# Altium footprint library SMDLibrary.PcbLib: 309 footprints (part 12 of 20)
Each footprint in its own frame and in the unit in brackets; x right, y up, seen from the top. Pads: shape width x height; smd on the part's side, far side on the other; paste and mask are expansions set on the pad; w line width, h text height; cw(c..) or ccw(c..) is an arc to the next point about the centre after c.
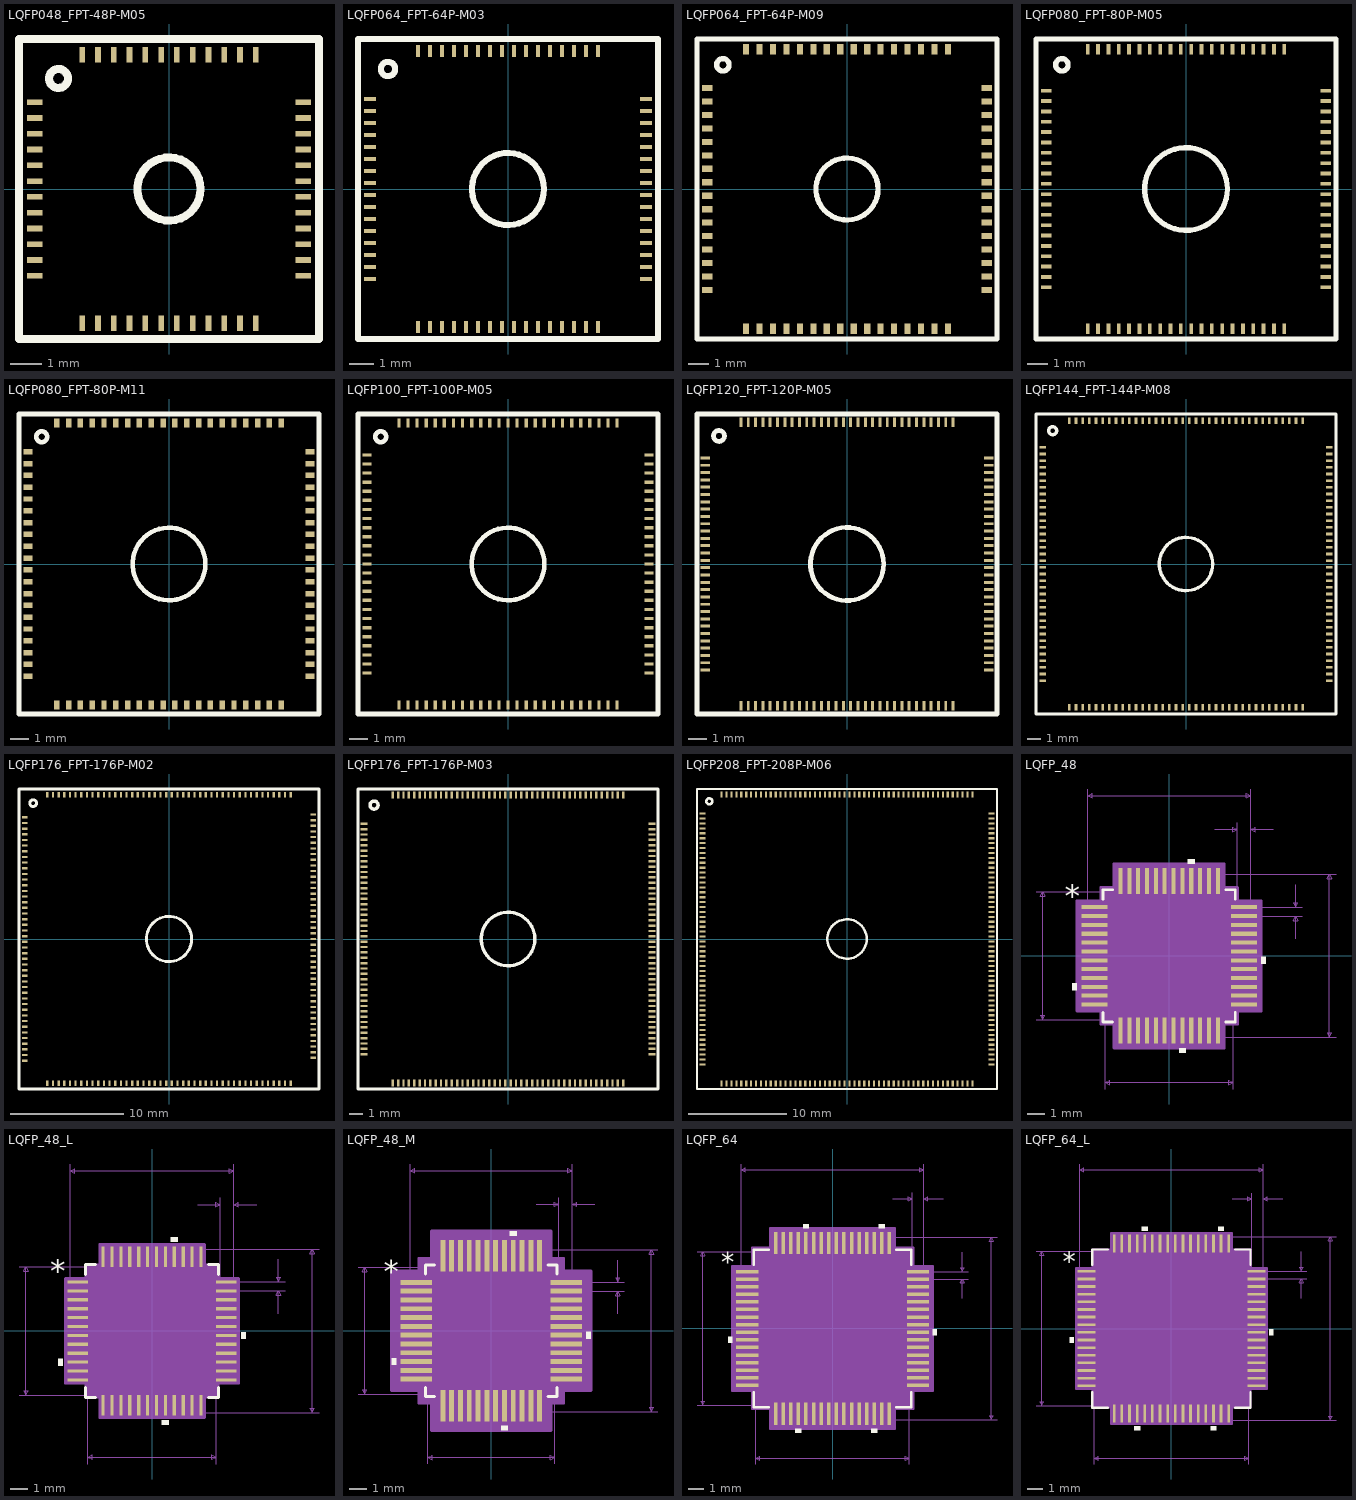
[diagram p11: the footprints below, top view; thin cyan lines are the x and y axes]

## LQFP048_FPT-48P-M05 [mm]
pads (48):
  rect 0.5x0.18 smd: 1(-4.25,2.75) 2(-4.25,2.25) 3(-4.25,1.75) 4(-4.25,1.25) 5(-4.25,0.75) 6(-4.25,0.25) 7(-4.25,-0.25) 8(-4.25,-0.75) 9(-4.25,-1.25) 10(-4.25,-1.75) 11(-4.25,-2.25) 12(-4.25,-2.75) 25(4.25,-2.75) 26(4.25,-2.25) 27(4.25,-1.75) 28(4.25,-1.25) 29(4.25,-0.75) 30(4.25,-0.25) 31(4.25,0.25) 32(4.25,0.75) 33(4.25,1.25) 34(4.25,1.75) 35(4.25,2.25) 36(4.25,2.75)
  rect 0.18x0.5 smd: 13(-2.75,-4.25) 14(-2.25,-4.25) 15(-1.75,-4.25) 16(-1.25,-4.25) 17(-0.75,-4.25) 18(-0.25,-4.25) 19(0.25,-4.25) 20(0.75,-4.25) 21(1.25,-4.25) 22(1.75,-4.25) 23(2.25,-4.25) 24(2.75,-4.25) 37(2.75,4.25) 38(2.25,4.25) 39(1.75,4.25) 40(1.25,4.25) 41(0.75,4.25) 42(0.25,4.25) 43(-0.25,4.25) 44(-0.75,4.25) 45(-1.25,4.25) 46(-1.75,4.25) 47(-2.25,4.25) 48(-2.75,4.25)
Top Overlay:
  circle w0.254: c0,0 r1
  circle w0.254: c-3.5,3.5 r0.3
  lines w0.254: -4.75,-4.75 4.75,-4.75 4.75,4.75 -4.75,4.75 -4.75,-4.75
3D body "LQFP48_FPT-48P-M05.stp": height 1.5, standoff 0, extent -4.5,-4.5 4.5,4.5

## LQFP064_FPT-64P-M03 [mm]
pads (64):
  rect 0.5x0.18 smd: 1(-5.75,3.75) 2(-5.75,3.25) 3(-5.75,2.75) 4(-5.75,2.25) 5(-5.75,1.75) 6(-5.75,1.25) 7(-5.75,0.75) 8(-5.75,0.25) 9(-5.75,-0.25) 10(-5.75,-0.75) 11(-5.75,-1.25) 12(-5.75,-1.75) 13(-5.75,-2.25) 14(-5.75,-2.75) 15(-5.75,-3.25) 16(-5.75,-3.75) 33(5.75,-3.75) 34(5.75,-3.25) 35(5.75,-2.75) 36(5.75,-2.25) 37(5.75,-1.75) 38(5.75,-1.25) 39(5.75,-0.75) 40(5.75,-0.25) 41(5.75,0.25) 42(5.75,0.75) 43(5.75,1.25) 44(5.75,1.75) 45(5.75,2.25) 46(5.75,2.75) 47(5.75,3.25) 48(5.75,3.75)
  rect 0.18x0.5 smd: 17(-3.75,-5.75) 18(-3.25,-5.75) 19(-2.75,-5.75) 20(-2.25,-5.75) 21(-1.75,-5.75) 22(-1.25,-5.75) 23(-0.75,-5.75) 24(-0.25,-5.75) 25(0.25,-5.75) 26(0.75,-5.75) 27(1.25,-5.75) 28(1.75,-5.75) 29(2.25,-5.75) 30(2.75,-5.75) 31(3.25,-5.75) 32(3.75,-5.75) 49(3.75,5.75) 50(3.25,5.75) 51(2.75,5.75) 52(2.25,5.75) 53(1.75,5.75) 54(1.25,5.75) 55(0.75,5.75) 56(0.25,5.75) 57(-0.25,5.75) 58(-0.75,5.75) 59(-1.25,5.75) 60(-1.75,5.75) 61(-2.25,5.75) 62(-2.75,5.75) 63(-3.25,5.75) 64(-3.75,5.75)
Top Overlay:
  circle w0.254: c0,0 r1.5
  circle w0.254: c-5,5 r0.3
  lines w0.254: -6.25,-6.25 -6.25,6.25 6.25,6.25 6.25,-6.25 -6.25,-6.25
3D body "LQFP64_FPT-64P-M03.stp": height 1.5, standoff 0, extent -6,-6 6,6

## LQFP064_FPT-64P-M09 [mm]
pads (64):
  rect 0.5x0.3 smd: 1(-6.75,4.875) 2(-6.75,4.225) 3(-6.75,3.575) 4(-6.75,2.925) 5(-6.75,2.275) 6(-6.75,1.625) 7(-6.75,0.975) 8(-6.75,0.325) 9(-6.75,-0.325) 10(-6.75,-0.975) 11(-6.75,-1.625) 12(-6.75,-2.275) 13(-6.75,-2.925) 14(-6.75,-3.575) 15(-6.75,-4.225) 16(-6.75,-4.875) 33(6.75,-4.875) 34(6.75,-4.225) 35(6.75,-3.575) 36(6.75,-2.925) 37(6.75,-2.275) 38(6.75,-1.625) 39(6.75,-0.975) 40(6.75,-0.325) 41(6.75,0.325) 42(6.75,0.975) 43(6.75,1.625) 44(6.75,2.275) 45(6.75,2.925) 46(6.75,3.575) 47(6.75,4.225) 48(6.75,4.875)
  rect 0.3x0.5 smd: 17(-4.875,-6.75) 18(-4.225,-6.75) 19(-3.575,-6.75) 20(-2.925,-6.75) 21(-2.275,-6.75) 22(-1.625,-6.75) 23(-0.975,-6.75) 24(-0.325,-6.75) 25(0.325,-6.75) 26(0.975,-6.75) 27(1.625,-6.75) 28(2.275,-6.75) 29(2.925,-6.75) 30(3.575,-6.75) 31(4.225,-6.75) 32(4.875,-6.75) 49(4.875,6.75) 50(4.225,6.75) 51(3.575,6.75) 52(2.925,6.75) 53(2.275,6.75) 54(1.625,6.75) 55(0.975,6.75) 56(0.325,6.75) 57(-0.325,6.75) 58(-0.975,6.75) 59(-1.625,6.75) 60(-2.275,6.75) 61(-2.925,6.75) 62(-3.575,6.75) 63(-4.225,6.75) 64(-4.875,6.75)
Top Overlay:
  circle w0.254: c-6,6 r0.3
  circle w0.254: c0,0 r1.5
  lines w0.254: -7.25,-7.25 -7.25,7.25 7.25,7.25 7.25,-7.25 -7.25,-7.25
3D body "LQFP64_FPT-64P-M09.stp": height 1.5, standoff 0, extent -7,-7 7,7

## LQFP080_FPT-80P-M05 [mm]
pads (80):
  rect 0.5x0.18 smd: 1(-6.75,4.75) 2(-6.75,4.25) 3(-6.75,3.75) 4(-6.75,3.25) 5(-6.75,2.75) 6(-6.75,2.25) 7(-6.75,1.75) 8(-6.75,1.25) 9(-6.75,0.75) 10(-6.75,0.25) 11(-6.75,-0.25) 12(-6.75,-0.75) 13(-6.75,-1.25) 14(-6.75,-1.75) 15(-6.75,-2.25) 16(-6.75,-2.75) 17(-6.75,-3.25) 18(-6.75,-3.75) 19(-6.75,-4.25) 20(-6.75,-4.75) 41(6.75,-4.75) 42(6.75,-4.25) 43(6.75,-3.75) 44(6.75,-3.25) 45(6.75,-2.75) 46(6.75,-2.25) 47(6.75,-1.75) 48(6.75,-1.25) 49(6.75,-0.75) 50(6.75,-0.25) 51(6.75,0.25) 52(6.75,0.75) 53(6.75,1.25) 54(6.75,1.75) 55(6.75,2.25) 56(6.75,2.75) 57(6.75,3.25) 58(6.75,3.75) 59(6.75,4.25) 60(6.75,4.75)
  rect 0.18x0.5 smd: 21(-4.75,-6.75) 22(-4.25,-6.75) 23(-3.75,-6.75) 24(-3.25,-6.75) 25(-2.75,-6.75) 26(-2.25,-6.75) 27(-1.75,-6.75) 28(-1.25,-6.75) 29(-0.75,-6.75) 30(-0.25,-6.75) 31(0.25,-6.75) 32(0.75,-6.75) 33(1.25,-6.75) 34(1.75,-6.75) 35(2.25,-6.75) 36(2.75,-6.75) 37(3.25,-6.75) 38(3.75,-6.75) 39(4.25,-6.75) 40(4.75,-6.75) 61(4.75,6.75) 62(4.25,6.75) 63(3.75,6.75) 64(3.25,6.75) 65(2.75,6.75) 66(2.25,6.75) 67(1.75,6.75) 68(1.25,6.75) 69(0.75,6.75) 70(0.25,6.75) 71(-0.25,6.75) 72(-0.75,6.75) 73(-1.25,6.75) 74(-1.75,6.75) 75(-2.25,6.75) 76(-2.75,6.75) 77(-3.25,6.75) 78(-3.75,6.75) 79(-4.25,6.75) 80(-4.75,6.75)
Top Overlay:
  circle w0.254: c0,0 r2
  circle w0.254: c-6,6 r0.3
  lines w0.254: -7.25,-7.25 -7.25,7.25 7.25,7.25 7.25,-7.25 -7.25,-7.25
3D body "LQFP80_FPT-80P-M05.stp": height 1.5, standoff 0, extent -7,-7 7,7

## LQFP080_FPT-80P-M11 [mm]
pads (80):
  rect 0.5x0.3 smd: 1(-7.75,6.175) 2(-7.75,5.525) 3(-7.75,4.875) 4(-7.75,4.225) 5(-7.75,3.575) 6(-7.75,2.925) 7(-7.75,2.275) 8(-7.75,1.625) 9(-7.75,0.975) 10(-7.75,0.325) 11(-7.75,-0.325) 12(-7.75,-0.975) 13(-7.75,-1.625) 14(-7.75,-2.275) 15(-7.75,-2.925) 16(-7.75,-3.575) 17(-7.75,-4.225) 18(-7.75,-4.875) 19(-7.75,-5.525) 20(-7.75,-6.175) 41(7.75,-6.175) 42(7.75,-5.525) 43(7.75,-4.875) 44(7.75,-4.225) 45(7.75,-3.575) 46(7.75,-2.925) 47(7.75,-2.275) 48(7.75,-1.625) 49(7.75,-0.975) 50(7.75,-0.325) 51(7.75,0.325) 52(7.75,0.975) 53(7.75,1.625) 54(7.75,2.275) 55(7.75,2.925) 56(7.75,3.575) 57(7.75,4.225) 58(7.75,4.875) 59(7.75,5.525) 60(7.75,6.175)
  rect 0.3x0.5 smd: 21(-6.175,-7.75) 22(-5.525,-7.75) 23(-4.875,-7.75) 24(-4.225,-7.75) 25(-3.575,-7.75) 26(-2.925,-7.75) 27(-2.275,-7.75) 28(-1.625,-7.75) 29(-0.975,-7.75) 30(-0.325,-7.75) 31(0.325,-7.75) 32(0.975,-7.75) 33(1.625,-7.75) 34(2.275,-7.75) 35(2.925,-7.75) 36(3.575,-7.75) 37(4.225,-7.75) 38(4.875,-7.75) 39(5.525,-7.75) 40(6.175,-7.75) 61(6.175,7.75) 62(5.525,7.75) 63(4.875,7.75) 64(4.225,7.75) 65(3.575,7.75) 66(2.925,7.75) 67(2.275,7.75) 68(1.625,7.75) 69(0.975,7.75) 70(0.325,7.75) 71(-0.325,7.75) 72(-0.975,7.75) 73(-1.625,7.75) 74(-2.275,7.75) 75(-2.925,7.75) 76(-3.575,7.75) 77(-4.225,7.75) 78(-4.875,7.75) 79(-5.525,7.75) 80(-6.175,7.75)
Top Overlay:
  circle w0.254: c0,0 r2
  circle w0.254: c-7,7 r0.3
  lines w0.254: -8.25,-8.25 -8.25,8.25 8.25,8.25 8.25,-8.25 -8.25,-8.25
3D body "LQFP80_FPT-80P-M11.stp": height 1.5, standoff 0, extent -8,-8 8,8

## LQFP100_FPT-100P-M05 [mm]
pads (100):
  rect 0.5x0.18 smd: 1(-7.75,6) 2(-7.75,5.5) 3(-7.75,5) 4(-7.75,4.5) 5(-7.75,4) 6(-7.75,3.5) 7(-7.75,3) 8(-7.75,2.5) 9(-7.75,2) 10(-7.75,1.5) 11(-7.75,1) 12(-7.75,0.5) 13(-7.75,0) 14(-7.75,-0.5) 15(-7.75,-1) 16(-7.75,-1.5) 17(-7.75,-2) 18(-7.75,-2.5) 19(-7.75,-3) 20(-7.75,-3.5) 21(-7.75,-4) 22(-7.75,-4.5) 23(-7.75,-5) 24(-7.75,-5.5) 25(-7.75,-6) 51(7.75,-6) 52(7.75,-5.5) 53(7.75,-5) 54(7.75,-4.5) 55(7.75,-4) 56(7.75,-3.5) 57(7.75,-3) 58(7.75,-2.5) 59(7.75,-2) 60(7.75,-1.5) 61(7.75,-1) 62(7.75,-0.5) 63(7.75,0) 64(7.75,0.5) 65(7.75,1) 66(7.75,1.5) 67(7.75,2) 68(7.75,2.5) 69(7.75,3) 70(7.75,3.5) 71(7.75,4) 72(7.75,4.5) 73(7.75,5) 74(7.75,5.5) 75(7.75,6)
  rect 0.18x0.5 smd: 26(-6,-7.75) 27(-5.5,-7.75) 28(-5,-7.75) 29(-4.5,-7.75) 30(-4,-7.75) 31(-3.5,-7.75) 32(-3,-7.75) 33(-2.5,-7.75) 34(-2,-7.75) 35(-1.5,-7.75) 36(-1,-7.75) 37(-0.5,-7.75) 38(0,-7.75) 39(0.5,-7.75) 40(1,-7.75) 41(1.5,-7.75) 42(2,-7.75) 43(2.5,-7.75) 44(3,-7.75) 45(3.5,-7.75) 46(4,-7.75) 47(4.5,-7.75) 48(5,-7.75) 49(5.5,-7.75) 50(6,-7.75) 76(6,7.75) 77(5.5,7.75) 78(5,7.75) 79(4.5,7.75) 80(4,7.75) 81(3.5,7.75) 82(3,7.75) 83(2.5,7.75) 84(2,7.75) 85(1.5,7.75) 86(1,7.75) 87(0.5,7.75) 88(0,7.75) 89(-0.5,7.75) 90(-1,7.75) 91(-1.5,7.75) 92(-2,7.75) 93(-2.5,7.75) 94(-3,7.75) 95(-3.5,7.75) 96(-4,7.75) 97(-4.5,7.75) 98(-5,7.75) 99(-5.5,7.75) 100(-6,7.75)
Top Overlay:
  circle w0.254: c-7,7 r0.3
  circle w0.254: c0,0 r2
  lines w0.254: -8.25,-8.25 -8.25,8.25 8.25,8.25 8.25,-8.25 -8.25,-8.25
3D body "LQFP100_FPT-100P-M05.stp": height 1.5, standoff 0, extent -8,-8 8,8

## LQFP120_FPT-120P-M05 [mm]
pads (120):
  rect 0.5x0.16 smd: 1(-7.75,5.8) 2(-7.75,5.4) 3(-7.75,5) 4(-7.75,4.6) 5(-7.75,4.2) 6(-7.75,3.8) 7(-7.75,3.4) 8(-7.75,3) 9(-7.75,2.6) 10(-7.75,2.2) 11(-7.75,1.8) 12(-7.75,1.4) 13(-7.75,1) 14(-7.75,0.6) 15(-7.75,0.2) 16(-7.75,-0.2) 17(-7.75,-0.6) 18(-7.75,-1) 19(-7.75,-1.4) 20(-7.75,-1.8) 21(-7.75,-2.2) 22(-7.75,-2.6) 23(-7.75,-3) 24(-7.75,-3.4) 25(-7.75,-3.8) 26(-7.75,-4.2) 27(-7.75,-4.6) 28(-7.75,-5) 29(-7.75,-5.4) 30(-7.75,-5.8) 61(7.75,-5.8) 62(7.75,-5.4) 63(7.75,-5) 64(7.75,-4.6) 65(7.75,-4.2) 66(7.75,-3.8) 67(7.75,-3.4) 68(7.75,-3) 69(7.75,-2.6) 70(7.75,-2.2) 71(7.75,-1.8) 72(7.75,-1.4) 73(7.75,-1) 74(7.75,-0.6) 75(7.75,-0.2) 76(7.75,0.2) 77(7.75,0.6) 78(7.75,1) 79(7.75,1.4) 80(7.75,1.8) 81(7.75,2.2) 82(7.75,2.6) 83(7.75,3) 84(7.75,3.4) 85(7.75,3.8) 86(7.75,4.2) 87(7.75,4.6) 88(7.75,5) 89(7.75,5.4) 90(7.75,5.8)
  rect 0.16x0.5 smd: 31(-5.8,-7.75) 32(-5.4,-7.75) 33(-5,-7.75) 34(-4.6,-7.75) 35(-4.2,-7.75) 36(-3.8,-7.75) 37(-3.4,-7.75) 38(-3,-7.75) 39(-2.6,-7.75) 40(-2.2,-7.75) 41(-1.8,-7.75) 42(-1.4,-7.75) 43(-1,-7.75) 44(-0.6,-7.75) 45(-0.2,-7.75) 46(0.2,-7.75) 47(0.6,-7.75) 48(1,-7.75) 49(1.4,-7.75) 50(1.8,-7.75) 51(2.2,-7.75) 52(2.6,-7.75) 53(3,-7.75) 54(3.4,-7.75) 55(3.8,-7.75) 56(4.2,-7.75) 57(4.6,-7.75) 58(5,-7.75) 59(5.4,-7.75) 60(5.8,-7.75) 91(5.8,7.75) 92(5.4,7.75) 93(5,7.75) 94(4.6,7.75) 95(4.2,7.75) 96(3.8,7.75) 97(3.4,7.75) 98(3,7.75) 99(2.6,7.75) 100(2.2,7.75) 101(1.8,7.75) 102(1.4,7.75) 103(1,7.75) 104(0.6,7.75) 105(0.2,7.75) 106(-0.2,7.75) 107(-0.6,7.75) 108(-1,7.75) 109(-1.4,7.75) 110(-1.8,7.75) 111(-2.2,7.75) 112(-2.6,7.75) 113(-3,7.75) 114(-3.4,7.75) 115(-3.8,7.75) 116(-4.2,7.75) 117(-4.6,7.75) 118(-5,7.75) 119(-5.4,7.75) 120(-5.8,7.75)
Top Overlay:
  circle w0.254: c-7,7 r0.3
  circle w0.254: c0,0 r2
  lines w0.254: -8.2,-8.2 -8.2,8.2 8.2,8.2 8.2,-8.2 -8.2,-8.2
3D body "LQFP120_FPT-120P-M05.stp": height 1.5, standoff 0, extent -8,-8 8,8

## LQFP144_FPT-144P-M08 [mm]
pads (144):
  rect 0.5x0.2 smd: 1(-10.75,8.75) 2(-10.75,8.25) 3(-10.75,7.75) 4(-10.75,7.25) 5(-10.75,6.75) 6(-10.75,6.25) 7(-10.75,5.75) 8(-10.75,5.25) 9(-10.75,4.75) 10(-10.75,4.25) 11(-10.75,3.75) 12(-10.75,3.25) 13(-10.75,2.75) 14(-10.75,2.25) 15(-10.75,1.75) 16(-10.75,1.25) 17(-10.75,0.75) 18(-10.75,0.25) 19(-10.75,-0.25) 20(-10.75,-0.75) 21(-10.75,-1.25) 22(-10.75,-1.75) 23(-10.75,-2.25) 24(-10.75,-2.75) 25(-10.75,-3.25) 26(-10.75,-3.75) 27(-10.75,-4.25) 28(-10.75,-4.75) 29(-10.75,-5.25) 30(-10.75,-5.75) 31(-10.75,-6.25) 32(-10.75,-6.75) 33(-10.75,-7.25) 34(-10.75,-7.75) 35(-10.75,-8.25) 36(-10.75,-8.75) 73(10.75,-8.75) 74(10.75,-8.25) 75(10.75,-7.75) 76(10.75,-7.25) 77(10.75,-6.75) 78(10.75,-6.25) 79(10.75,-5.75) 80(10.75,-5.25) 81(10.75,-4.75) 82(10.75,-4.25) 83(10.75,-3.75) 84(10.75,-3.25) 85(10.75,-2.75) 86(10.75,-2.25) 87(10.75,-1.75) 88(10.75,-1.25) 89(10.75,-0.75) 90(10.75,-0.25) 91(10.75,0.25) 92(10.75,0.75) 93(10.75,1.25) 94(10.75,1.75) 95(10.75,2.25) 96(10.75,2.75) 97(10.75,3.25) 98(10.75,3.75) 99(10.75,4.25) 100(10.75,4.75) 101(10.75,5.25) 102(10.75,5.75) 103(10.75,6.25) 104(10.75,6.75) 105(10.75,7.25) 106(10.75,7.75) 107(10.75,8.25) 108(10.75,8.75)
  rect 0.2x0.5 smd: 37(-8.75,-10.75) 38(-8.25,-10.75) 39(-7.75,-10.75) 40(-7.25,-10.75) 41(-6.75,-10.75) 42(-6.25,-10.75) 43(-5.75,-10.75) 44(-5.25,-10.75) 45(-4.75,-10.75) 46(-4.25,-10.75) 47(-3.75,-10.75) 48(-3.25,-10.75) 49(-2.75,-10.75) 50(-2.25,-10.75) 51(-1.75,-10.75) 52(-1.25,-10.75) 53(-0.75,-10.75) 54(-0.25,-10.75) 55(0.25,-10.75) 56(0.75,-10.75) 57(1.25,-10.75) 58(1.75,-10.75) 59(2.25,-10.75) 60(2.75,-10.75) 61(3.25,-10.75) 62(3.75,-10.75) 63(4.25,-10.75) 64(4.75,-10.75) 65(5.25,-10.75) 66(5.75,-10.75) 67(6.25,-10.75) 68(6.75,-10.75) 69(7.25,-10.75) 70(7.75,-10.75) 71(8.25,-10.75) 72(8.75,-10.75) 109(8.75,10.75) 110(8.25,10.75) 111(7.75,10.75) 112(7.25,10.75) 113(6.75,10.75) 114(6.25,10.75) 115(5.75,10.75) 116(5.25,10.75) 117(4.75,10.75) 118(4.25,10.75) 119(3.75,10.75) 120(3.25,10.75) 121(2.75,10.75) 122(2.25,10.75) 123(1.75,10.75) 124(1.25,10.75) 125(0.75,10.75) 126(0.25,10.75) 127(-0.25,10.75) 128(-0.75,10.75) 129(-1.25,10.75) 130(-1.75,10.75) 131(-2.25,10.75) 132(-2.75,10.75) 133(-3.25,10.75) 134(-3.75,10.75) 135(-4.25,10.75) 136(-4.75,10.75) 137(-5.25,10.75) 138(-5.75,10.75) 139(-6.25,10.75) 140(-6.75,10.75) 141(-7.25,10.75) 142(-7.75,10.75) 143(-8.25,10.75) 144(-8.75,10.75)
Top Overlay:
  circle w0.254: c0,0 r2
  circle w0.254: c-10,10 r0.3
  lines w0.254: -11.25,-11.25 -11.25,11.25 11.25,11.25 11.25,-11.25 -11.25,-11.25
3D body "LQFP144_FPT-144P-M08.stp": height 1.7, standoff 0, extent -11,-11 11,11

## LQFP176_FPT-176P-M02 [mm]
pads (176):
  rect 0.5x0.2 smd: 1(-12.75,10.75) 2(-12.75,10.25) 3(-12.75,9.75) 4(-12.75,9.25) 5(-12.75,8.75) 6(-12.75,8.25) 7(-12.75,7.75) 8(-12.75,7.25) 9(-12.75,6.75) 10(-12.75,6.25) 11(-12.75,5.75) 12(-12.75,5.25) 13(-12.75,4.75) 14(-12.75,4.25) 15(-12.75,3.75) 16(-12.75,3.25) 17(-12.75,2.75) 18(-12.75,2.25) 19(-12.75,1.75) 20(-12.75,1.25) 21(-12.75,0.75) 22(-12.75,0.25) 23(-12.75,-0.25) 24(-12.75,-0.75) 25(-12.75,-1.25) 26(-12.75,-1.75) 27(-12.75,-2.25) 28(-12.75,-2.75) 29(-12.75,-3.25) 30(-12.75,-3.75) 31(-12.75,-4.25) 32(-12.75,-4.75) 33(-12.75,-5.25) 34(-12.75,-5.75) 35(-12.75,-6.25) 36(-12.75,-6.75) 37(-12.75,-7.25) 38(-12.75,-7.75) 39(-12.75,-8.25) 40(-12.75,-8.75) 41(-12.75,-9.25) 42(-12.75,-9.75) 43(-12.75,-10.25) 44(-12.75,-10.75) 89(12.75,-10.5) 90(12.75,-10) 91(12.75,-9.5) 92(12.75,-9) 93(12.75,-8.5) 94(12.75,-8) 95(12.75,-7.5) 96(12.75,-7) 97(12.75,-6.5) 98(12.75,-6) 99(12.75,-5.5) 100(12.75,-5) 101(12.75,-4.5) 102(12.75,-4) 103(12.75,-3.5) 104(12.75,-3) 105(12.75,-2.5) 106(12.75,-2) 107(12.75,-1.5) 108(12.75,-1) 109(12.75,-0.5) 110(12.75,0) 111(12.75,0.5) 112(12.75,1) 113(12.75,1.5) 114(12.75,2) 115(12.75,2.5) 116(12.75,3) 117(12.75,3.5) 118(12.75,4) 119(12.75,4.5) 120(12.75,5) 121(12.75,5.5) 122(12.75,6) 123(12.75,6.5) 124(12.75,7) 125(12.75,7.5) 126(12.75,8) 127(12.75,8.5) 128(12.75,9) 129(12.75,9.5) 130(12.75,10) 131(12.75,10.5) 132(12.75,11)
  rect 0.2x0.5 smd: 45(-10.75,-12.75) 46(-10.25,-12.75) 47(-9.75,-12.75) 48(-9.25,-12.75) 49(-8.75,-12.75) 50(-8.25,-12.75) 51(-7.75,-12.75) 52(-7.25,-12.75) 53(-6.75,-12.75) 54(-6.25,-12.75) 55(-5.75,-12.75) 56(-5.25,-12.75) 57(-4.75,-12.75) 58(-4.25,-12.75) 59(-3.75,-12.75) 60(-3.25,-12.75) 61(-2.75,-12.75) 62(-2.25,-12.75) 63(-1.75,-12.75) 64(-1.25,-12.75) 65(-0.75,-12.75) 66(-0.25,-12.75) 67(0.25,-12.75) 68(0.75,-12.75) 69(1.25,-12.75) 70(1.75,-12.75) 71(2.25,-12.75) 72(2.75,-12.75) 73(3.25,-12.75) 74(3.75,-12.75) 75(4.25,-12.75) 76(4.75,-12.75) 77(5.25,-12.75) 78(5.75,-12.75) 79(6.25,-12.75) 80(6.75,-12.75) 81(7.25,-12.75) 82(7.75,-12.75) 83(8.25,-12.75) 84(8.75,-12.75) 85(9.25,-12.75) 86(9.75,-12.75) 87(10.25,-12.75) 88(10.75,-12.75) 133(10.75,12.75) 134(10.25,12.75) 135(9.75,12.75) 136(9.25,12.75) 137(8.75,12.75) 138(8.25,12.75) 139(7.75,12.75) 140(7.25,12.75) 141(6.75,12.75) 142(6.25,12.75) 143(5.75,12.75) 144(5.25,12.75) 145(4.75,12.75) 146(4.25,12.75) 147(3.75,12.75) 148(3.25,12.75) 149(2.75,12.75) 150(2.25,12.75) 151(1.75,12.75) 152(1.25,12.75) 153(0.75,12.75) 154(0.25,12.75) 155(-0.25,12.75) 156(-0.75,12.75) 157(-1.25,12.75) 158(-1.75,12.75) 159(-2.25,12.75) 160(-2.75,12.75) 161(-3.25,12.75) 162(-3.75,12.75) 163(-4.25,12.75) 164(-4.75,12.75) 165(-5.25,12.75) 166(-5.75,12.75) 167(-6.25,12.75) 168(-6.75,12.75) 169(-7.25,12.75) 170(-7.75,12.75) 171(-8.25,12.75) 172(-8.75,12.75) 173(-9.25,12.75) 174(-9.75,12.75) 175(-10.25,12.75) 176(-10.75,12.75)
Top Overlay:
  circle w0.254: c-12,12 r0.3
  circle w0.254: c0,0 r2
  lines w0.254: -13.25,-13.25 -13.25,13.25 13.25,13.25 13.25,-13.25 -13.25,-13.25
3D body "LQFP176_FPT-176P-M02.stp": height 1.5, standoff 0, extent -13,-13 13,13

## LQFP176_FPT-176P-M03 [mm]
pads (176):
  rect 0.5x0.18 smd: 1(-10.75,8.6) 2(-10.75,8.2) 3(-10.75,7.8) 4(-10.75,7.4) 5(-10.75,7) 6(-10.75,6.6) 7(-10.75,6.2) 8(-10.75,5.8) 9(-10.75,5.4) 10(-10.75,5) 11(-10.75,4.6) 12(-10.75,4.2) 13(-10.75,3.8) 14(-10.75,3.4) 15(-10.75,3) 16(-10.75,2.6) 17(-10.75,2.2) 18(-10.75,1.8) 19(-10.75,1.4) 20(-10.75,1) 21(-10.75,0.6) 22(-10.75,0.2) 23(-10.75,-0.2) 24(-10.75,-0.6) 25(-10.75,-1) 26(-10.75,-1.4) 27(-10.75,-1.8) 28(-10.75,-2.2) 29(-10.75,-2.6) 30(-10.75,-3) 31(-10.75,-3.4) 32(-10.75,-3.8) 33(-10.75,-4.2) 34(-10.75,-4.6) 35(-10.75,-5) 36(-10.75,-5.4) 37(-10.75,-5.8) 38(-10.75,-6.2) 39(-10.75,-6.6) 40(-10.75,-7) 41(-10.75,-7.4) 42(-10.75,-7.8) 43(-10.75,-8.2) 44(-10.75,-8.6) 89(10.75,-8.6) 90(10.75,-8.2) 91(10.75,-7.8) 92(10.75,-7.4) 93(10.75,-7) 94(10.75,-6.6) 95(10.75,-6.2) 96(10.75,-5.8) 97(10.75,-5.4) 98(10.75,-5) 99(10.75,-4.6) 100(10.75,-4.2) 101(10.75,-3.8) 102(10.75,-3.4) 103(10.75,-3) 104(10.75,-2.6) 105(10.75,-2.2) 106(10.75,-1.8) 107(10.75,-1.4) 108(10.75,-1) 109(10.75,-0.6) 110(10.75,-0.2) 111(10.75,0.2) 112(10.75,0.6) 113(10.75,1) 114(10.75,1.4) 115(10.75,1.8) 116(10.75,2.2) 117(10.75,2.6) 118(10.75,3) 119(10.75,3.4) 120(10.75,3.8) 121(10.75,4.2) 122(10.75,4.6) 123(10.75,5) 124(10.75,5.4) 125(10.75,5.8) 126(10.75,6.2) 127(10.75,6.6) 128(10.75,7) 129(10.75,7.4) 130(10.75,7.8) 131(10.75,8.2) 132(10.75,8.6)
  rect 0.18x0.5 smd: 45(-8.6,-10.75) 46(-8.2,-10.75) 47(-7.8,-10.75) 48(-7.4,-10.75) 49(-7,-10.75) 50(-6.6,-10.75) 51(-6.2,-10.75) 52(-5.8,-10.75) 53(-5.4,-10.75) 54(-5,-10.75) 55(-4.6,-10.75) 56(-4.2,-10.75) 57(-3.8,-10.75) 58(-3.4,-10.75) 59(-3,-10.75) 60(-2.6,-10.75) 61(-2.2,-10.75) 62(-1.8,-10.75) 63(-1.4,-10.75) 64(-1,-10.75) 65(-0.6,-10.75) 66(-0.2,-10.75) 67(0.2,-10.75) 68(0.6,-10.75) 69(1,-10.75) 70(1.4,-10.75) 71(1.8,-10.75) 72(2.2,-10.75) 73(2.6,-10.75) 74(3,-10.75) 75(3.4,-10.75) 76(3.8,-10.75) 77(4.2,-10.75) 78(4.6,-10.75) 79(5,-10.75) 80(5.4,-10.75) 81(5.8,-10.75) 82(6.2,-10.75) 83(6.6,-10.75) 84(7,-10.75) 85(7.4,-10.75) 86(7.8,-10.75) 87(8.2,-10.75) 88(8.6,-10.75) 133(8.6,10.75) 134(8.2,10.75) 135(7.8,10.75) 136(7.4,10.75) 137(7,10.75) 138(6.6,10.75) 139(6.2,10.75) 140(5.8,10.75) 141(5.4,10.75) 142(5,10.75) 143(4.6,10.75) 144(4.2,10.75) 145(3.8,10.75) 146(3.4,10.75) 147(3,10.75) 148(2.6,10.75) 149(2.2,10.75) 150(1.8,10.75) 151(1.4,10.75) 152(1,10.75) 153(0.6,10.75) 154(0.2,10.75) 155(-0.2,10.75) 156(-0.6,10.75) 157(-1,10.75) 158(-1.4,10.75) 159(-1.8,10.75) 160(-2.2,10.75) 161(-2.6,10.75) 162(-3,10.75) 163(-3.4,10.75) 164(-3.8,10.75) 165(-4.2,10.75) 166(-4.6,10.75) 167(-5,10.75) 168(-5.4,10.75) 169(-5.8,10.75) 170(-6.2,10.75) 171(-6.6,10.75) 172(-7,10.75) 173(-7.4,10.75) 174(-7.8,10.75) 175(-8.2,10.75) 176(-8.6,10.75)